# Altium footprint library BARKO_PCBLIB.PcbLib: 531 footprints (part 3 of 34)
Each footprint in its own frame and in the unit in brackets; x right, y up, seen from the top. Pads: shape width x height; smd on the part's side, far side on the other; paste and mask are expansions set on the pad; w line width, h text height; cw(c..) or ccw(c..) is an arc to the next point about the centre after c.
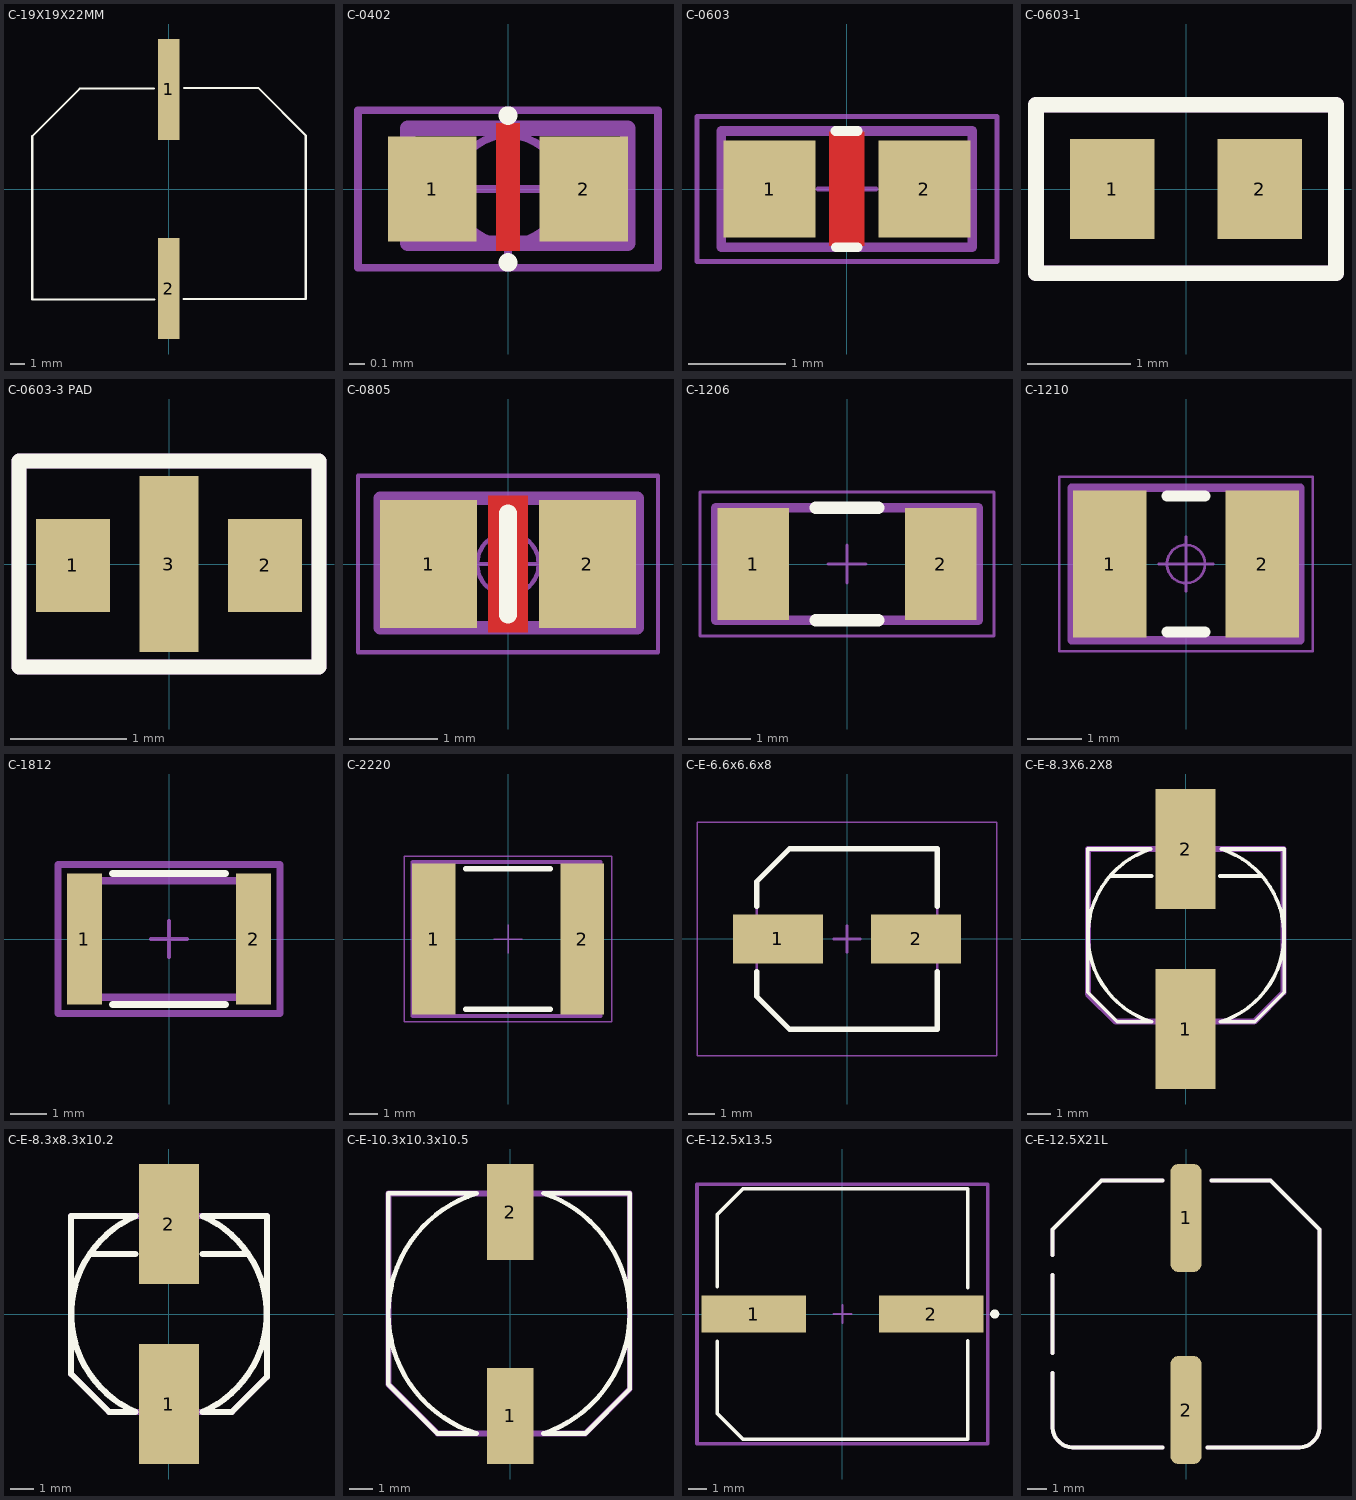
[diagram p2: the footprints below, top view; thin cyan lines are the x and y axes]

## C-19X19X22MM [mm]
pads (2):
  rect 1.5x7 smd: 1(0,6.9) 2(0,-6.9)
Top Overlay:
  lines w0.152: -1.041,6.96 -6.172,6.96 -9.474,3.658 -9.474,-7.671 -0.991,-7.671 ; 1.016,-7.62 9.5,-7.62 9.5,3.708 6.198,7.01 1.067,7.01

## C-0402 [mm]
pads (2):
  rect 0.57x0.68 smd: 1(-0.49,0) 2(0.49,0)
Top Layer:
  pour cut-out: -0.075,0.425 -0.075,-0.4 0.075,-0.4 0.075,0.425
Top Overlay:
  circle w0.1: c0,-0.475 r0.01
  circle w0.1: c0,0.475 r0.01
Mechanical 15:
  circle w0.05: c0,0 r0.35
  lines w0.05: -0.5,0 0.5,0 ; 0,-0.5 0,0.5 ; -0.97,-0.51 -0.97,0.51 0.97,0.51 0.97,-0.51 -0.97,-0.51
ASM Top:
  lines w0.1: -0.648,-0.35 -0.648,0.393 0.775,0.393 0.775,-0.35 -0.648,-0.35
  text ".designator" at -0.299,-0.183 h0.8
3D body "CAPC1005X55N EIA 0402.step": height 0.51, standoff 0.01, extent -0.517,-0.264 0.483,0.286
3D body: height 0.25, standoff 0, extent 0,0 0,0

## C-0603 [mm]
pads (2):
  rect 0.95x1 smd: 1(-0.8,0) 2(0.8,0)
Top Layer:
  pour cut-out: -0.184,0.591 -0.184,-0.586 0.177,-0.586 0.177,0.591
Top Overlay:
  lines w0.1: -0.118,0.6 0.112,0.6 ; -0.116,-0.6 0.112,-0.6
Mechanical 15:
  lines w0.05: -0.3,0 0.3,0 ; 0,-0.3 0,0.3 ; -1.55,-0.75 1.55,-0.75 1.55,0.75 -1.55,0.75 -1.55,-0.75
ASM Top:
  lines w0.1: -1.3,-0.6 -1.3,0.6 1.294,0.6 1.294,-0.6 -1.3,-0.6
  text ".designator" at -0.4,-0.3 h0.8
3D body "CAPC1508X65N EIA 0603.step": height 0.66, standoff 0.01, extent -0.756,-0.4 0.744,0.4

## C-0603-1 [mil]
pads (2):
  rect 32x38 smd mask+0: 1(-28,0) 2(28,0)
Top Overlay:
  lines w6: -57,-32 -57,32 57,32 57,-32 -57,-32
ASM Top:
  lines w6: -57,-32 -57,32 57,32 57,-32 -57,-32
  text ".designator" at -40,-15 h31.5
3D body "CAPC1508X65N EIA 0603.step": height 26.09, standoff 0.5, extent -29.53,-15.75 29.53,15.75

## C-0603-3 PAD [mm]
height 0.66
pads (3):
  rect 0.64x0.8 smd mask+0.051: 1(-0.83,-0.013) 2(0.83,-0.013)
  rect 0.51x1.52 smd paste+0 mask+0.051: 3(0,0)
Top Overlay:
  lines w0.127: -1.295,-0.889 1.295,-0.889 1.295,0.889 -1.295,0.889 -1.295,-0.889
ASM Top:
  lines w0.127: -1.295,-0.889 1.295,-0.889 1.295,0.889 -1.295,0.889 -1.295,-0.889
  text ".designator" at -0.229,-0.152 h0.8
3D body "X14.step": height 0.66, standoff 0, extent -0.876,-0.508 0.876,0.508

## C-0805 [mm]
pads (2):
  rect 1.1x1.45 smd: 1(-0.9,0) 2(0.9,0)
Top Layer:
  pour cut-out: -0.225,0.775 -0.225,-0.775 0.225,-0.775 0.225,0.775
Top Overlay:
  lines w0.2: 0,-0.575 0,0.575
Mechanical 15:
  circle w0.05: c0,0 r0.35
  lines w0.05: -0.5,0 0.5,0 ; 0,-0.5 0,0.5 ; -1.7,-1 1.7,-1 1.7,1 -1.7,1 -1.7,-1
ASM Top:
  lines w0.152: -1.449,-0.722 -1.449,0.744 1.467,0.744 1.467,-0.722 -1.449,-0.722
  text ".designator" at -0.642,-0.344 h0.8
3D body "CAPC2012X94N EIA 0805.step": height 0.95, standoff 0.01, extent -1,-0.6 1,0.6

## C-1206 [mm]
pads (2):
  rect 1.15x1.8 smd: 1(-1.5,0) 2(1.5,0)
Top Overlay:
  lines w0.2: -0.5,-0.9 0.5,-0.9 ; -0.5,0.9 0.5,0.9
Mechanical 15:
  lines w0.05: -0.3,0 0.3,0 ; 0,-0.3 0,0.3 ; -2.35,-1.15 -2.35,1.15 2.35,1.15 2.35,-1.15 -2.35,-1.15
ASM Top:
  lines w0.152: -2.1,-0.9 -2.1,0.9 2.1,0.9 2.1,-0.9 -2.1,-0.9
  text ".designator" at -0.7,-0.3 h0.8
3D body "CAPC3215X168N EIA 1206.step": height 1.51, standoff 0.01, extent -1.6,-0.842 1.6,0.838

## C-1210 [mm]
pads (2):
  rect 1.35x2.7 smd: 1(-1.4,0) 2(1.4,0)
Top Overlay:
  lines w0.2: -0.35,-1.25 0.35,-1.25 ; -0.35,1.25 0.35,1.25
Mechanical 15:
  circle w0.05: c0,0 r0.35
  lines w0.05: -0.5,0 0.5,0 ; 0,-0.5 0,0.5 ; -2.325,-1.6 -2.325,1.6 2.325,1.6 2.325,-1.6 -2.325,-1.6
ASM Top:
  lines w0.152: -2.1,-1.4 2.1,-1.4 2.1,1.4 -2.1,1.4 -2.1,-1.4
  text ".designator" at -0.8,-0.4 h0.8
3D body "CAPC3225X88N EIA 1210.step": height 0.89, standoff 0.01, extent -1.6,-1.255 1.6,1.245

## C-1812 [mm]
pads (2):
  rect 0.953x3.603 smd paste+0 mask+0: 1(-2.325,0) 2(2.325,0)
Top Overlay:
  lines w0.2: -1.548,-1.802 1.548,-1.802 ; -1.548,1.802 1.548,1.802
Mechanical 15:
  lines w0.1: -0.5,0 0.5,0 ; 0,-0.5 0,0.5
  lines w0.2: -3.052,-2.052 3.052,-2.052 3.052,2.052 -3.052,2.052 -3.052,-2.052
ASM Top:
  lines w0.2: -2.25,-1.6 -2.25,1.6 2.25,1.6 2.25,-1.6 -2.25,-1.6
  text ".Designator" at 0,0.188 h1
3D body "Cap_TDK_CGA8L1X7S3A103M160KA_eec.STEP": height 3.5, standoff 0, extent -2.25,-1.6 2.25,1.6

## C-2220 [mm]
pads (2):
  rect 1.55x5.4 smd: 1(-2.65,0) 2(2.65,0)
Top Overlay:
  lines w0.2: -1.5,-2.5 1.5,-2.5 ; -1.5,2.5 1.5,2.5
Mechanical 15:
  lines w0.05: -0.5,0 0.5,0 ; 0,-0.5 0,0.5 ; -3.7,-2.95 -3.7,2.95 3.7,2.95 3.7,-2.95 -3.7,-2.95
ASM Top:
  lines w0.152: -3.4,-2.743 3.3,-2.743 3.3,2.743 -3.4,2.743 -3.4,-2.743
  text ".designator" at -1.6,-0.4 h0.8
3D body "User Library-SMD Ceramic Capacitors_2220 (5650)_JL.step": height 2, standoff 0, extent -2.896,-2.5 2.947,2.5

## C-E-6.6x6.6x8 [mm] "Aluminum Electrolytic Capacitor, Body 6,60x6,60x8,00mm, IPC Low Density"
height 8
pads (2):
  rect 3.4x1.85 smd: 1(-2.6,0) 2(2.6,0)
Top Overlay:
  lines w0.2: -3.4,-1.225 -3.4,-2.163 -2.163,-3.4 3.4,-3.4 3.4,-1.225 ; -3.4,1.225 -3.4,2.163 -2.163,3.4 3.4,3.4 3.4,1.225
Mechanical 15:
  lines w0.05: -5.65,-4.4 -5.65,4.4 5.65,4.4 5.65,-4.4 -5.65,-4.4
  lines w0.1: -0.5,0 0.5,0 ; 0,-0.5 0,0.5
ASM Top:
  lines w0.1: -3.4,-2.163 -3.4,2.163 -2.163,3.4 3.4,3.4 3.4,-3.4 -2.163,-3.4 -3.4,-2.163
  text ".designator" at 0.4,-2.9 h0.8
3D body "C-E-6.6x6.6x8.step": height 8, standoff 0, extent -3.85,-3.4 3.85,3.4

## C-E-8.3X6.2X8 [mm]
pads (2):
  rect 2.54x5.08 smd: 1(0,-3.81) 2(0,3.81)
Top Overlay:
  lines w0.152: -3.2,2.667 -1.448,2.667 ; 1.448,2.667 3.226,2.667 ; -4.14,-2.261 -2.896,-3.505 -1.448,-3.505 cw(c-0.304,0.156) -1.473,3.81 -4.14,3.81 -4.14,-2.261 ; 1.473,-3.505 ccw(c0.33,0.156) 1.499,3.81 4.166,3.81 4.166,-2.261 2.921,-3.505 1.473,-3.505
ASM Top:
  lines w0.254: -4.14,-2.331 -4.14,3.8 -3.571,3.8 4.14,3.8 4.14,-2.26 2.9,-3.5 -2.971,-3.5 -4.14,-2.331
  text ".designator" at -2.642,-0.203 h0.8
3D body "C-8.3X8.3X8.step": height 6.52, standoff 0.01, extent -4.216,-4.961 4.284,4.639

## C-E-8.3x8.3x10.2 [mm]
pads (2):
  rect 2.54x5.08 smd mask+0: 1(0,-3.81) 2(0,3.81)
Top Overlay:
  lines w0.254: -3.327,2.54 -1.422,2.54 ; 1.422,2.54 3.302,2.54 ; -4.14,-2.54 -4.14,4.14 -1.422,4.14 ccw(c0.372,0) -1.422,-4.14 -2.54,-4.14 -4.14,-2.54 ; 1.422,-4.14 ccw(c-0.372,0) 1.422,4.14 4.14,4.14 4.14,-2.667 2.667,-4.14 1.422,-4.14
ASM Top:
  lines w0.254: -4.14,-2.54 -2.54,-4.14 2.667,-4.14 4.14,-2.667 4.14,4.14 -3.912,4.14 -4.14,4.14 -4.14,-2.54
  text ".designator" at -2.642,-0.203 h0.8
3D body "EDH107M050A9MAA.step": height 10.52, standoff 0.01, extent -4.258,-5.232 4.242,5.268

## C-E-10.3x10.3x10.5 [mm]
height 10.5
pads (2):
  rect 2x4.1 smd mask+0: 1(0,-4.35) 2(0,4.35)
Top Overlay:
  lines w0.2: -5.2,-3 -3.1,-5.1 -1.422,-5.1 cw(c0.163,0.025) -1.422,5.15 -5.2,5.15 -5.2,-3 ; 1.422,-5.1 ccw(c-0.309,0.025) 1.422,5.15 5.1,5.15 5.1,-3.2 3.2,-5.1 1.422,-5.1
ASM Top:
  lines w0.254: -5.2,-3 -3.1,-5.1 3.2,-5.1 5.1,-3.2 5.1,5.15 -5.2,5.15 -5.2,3.74 -5.2,-3
  text ".designator" at -2.642,-0.203 h0.8
3D body "10x10_Chip.stp": height 10, standoff 0, extent -5.15,-5.45 5.15,5.45

## C-E-12.5x13.5 [mm]
height 13.5
pads (2):
  rect 5.7x2 smd paste+0 mask+0: 1(-4.85,0) 2(4.85,0)
Top Overlay:
  circle w0.25: c8.325,0 r0.125
  lines w0.2: -6.85,-1.5 -6.85,-5.436 -5.436,-6.85 6.85,-6.85 6.85,-1.475 ; -6.85,1.5 -6.85,5.436 -5.436,6.85 6.85,6.85 ; 6.85,1.45 6.85,6.825
Mechanical 15:
  lines w0.1: -0.5,0 0.5,0 ; 0,-0.5 0,0.5
  lines w0.2: -7.95,-7.1 7.95,-7.1 7.95,7.1 -7.95,7.1 -7.95,-7.1
ASM Top:
  circle w0.2: c6.2,0 r0.1
  lines w0.2: -7.95,-7.1 7.95,-7.1 7.95,7.1 -7.95,7.1 -7.95,-7.1
  text ".designator" at 0.3,-0.3 h1.5
3D body "12.5X13.5_Chip.stp": height 13.5, standoff 0, extent -7.3,-6.8 7.3,6.8

## C-E-12.5X21L [mm]
pads (2):
  rrect50% 1.6x5.5 smd: 1(0,4.9) 2(0,-4.9)
Top Overlay:
  lines w0.2: -6.8,-3 -6.8,-5.8 ccw(c-5.775,-5.775) -5.8,-6.8 ; -6.8,-2 -6.8,2 ; -6.8,3 -6.8,4.3 -4.3,6.8 -1.2,6.8 ; 1.3,6.8 4.3,6.8 6.8,4.3 6.8,-5.8 cw(c5.775,-5.775) 5.8,-6.8 ; -5.8,-6.8 ccw(c-5.8,-6.8) -5.8,-6.8 ; -5.8,-6.8 -1.2,-6.8 ; -1.2,-6.8 ccw(c-1.2,-6.8) -1.2,-6.8 ; 1.1,-6.8 ccw(c1.1,-6.8) 1.1,-6.8 ; 1.1,-6.8 5.8,-6.8 ; 5.8,-6.8 ccw(c5.8,-6.8) 5.8,-6.8
ASM Top:
  lines w0.2: -6.8,-5.801 ccw(c-5.776,-5.776) -5.801,-6.8 ; -6.8,-5.776 -6.8,-3 ; -6.8,-2 -6.8,2 ; -6.8,3 -6.8,4.3 -4.3,6.8 -1.2,6.8 ; -5.776,-6.8 -1.2,-6.8 ; 1.3,6.8 4.3,6.8 6.8,4.3 6.8,-5.8 cw(c5.775,-5.775) 5.8,-6.8 ; -1.2,-6.8 ccw(c-1.2,-6.8) -1.2,-6.8 ; 1.1,-6.8 ccw(c1.1,-6.8) 1.1,-6.8 ; 1.1,-6.8 5.8,-6.8 ; 5.8,-6.8 ccw(c5.8,-6.8) 5.8,-6.8 ; -5.8,-6.8 ccw(c-5.8,-6.8) -5.8,-6.8
  text ".designator" at -1.5,-0.3 h0.8
3D body "12.5x21_Chip.stp": height 21.01, standoff 0.01, extent -6.8,-7.3 6.8,7.3